# Altium schematic symbol library Semi-ATE.SchLib: 322 symbols (part 1 of 6) (continued)
## ADA4807-1AKSZ (continued)
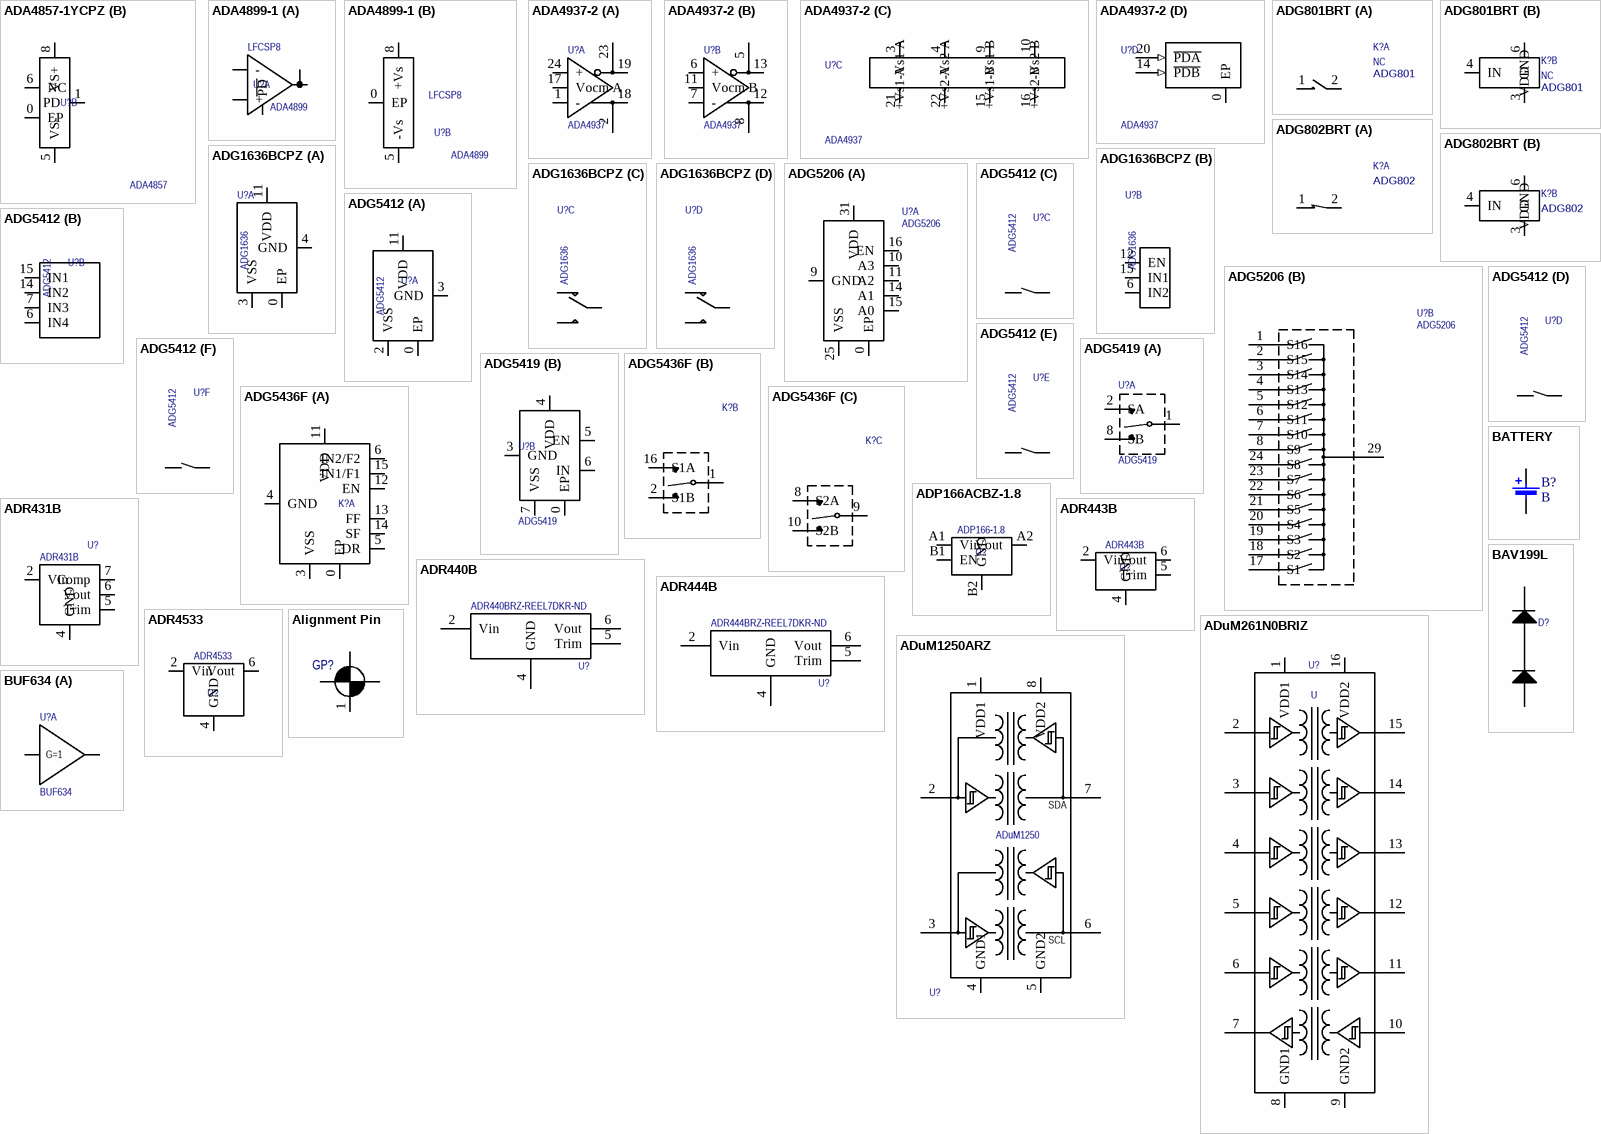
[diagram p4: symbols ADA4857-1YCPZ to BUF634]

## ADA4857-1YCPZ
designator U?, comment NicName: ADA4857  (hidden comment: U)
IC OPAMP VFB 1 CIRCUIT 8LFCSP; 04. Manufacturer: Analog Devices Inc.; 07. Manufacturer  Part Number: ADA4857-1YCPZ-R7; 03. Unit Price: 3.47; 13. Created Date/Name: AUG 2018 / Hören; ComponentLink1Description: Info; ComponentLink1URL: https://www.digikey.de/products/en/integrated-circuits-ics/linear-amplifiers-instrumentation-op-amps-buffer-amps/687?k=ADA4857-1YCPZ&k=&pkeyword=ADA4857-1YCPZ&sv=0&pv7=243&pv1989=0&sf=0&quantity=&ColumnSort=0&page=1&pageSize=25; ComponentLink2Description: DataSheet; ComponentLink2URL: https://www.analog.com/media/en/technical-documentation/data-sheets/ADA4857-1_4857-2.pdf; 01. Distributor: DigiKey; 02. Distributor Part Number: ADA4857-1YCPZ-R7DKR-ND; Package: 8-LFCSP-VD
footprint CP-8-13 (8-Lead LFCSP (3X3))
part A pins: 2 FB, 3 -, 4 +, 7 OUT
part B pins: 0 EP, 1 PD, 5 VS- (power), 6 NC, 8 VS+ (power)

## ADA4899-1
designator U?, comment Package: LFCSP8  NicName: ADA4899  (hidden comment: U)
IC OPAMP VFB 600MHZ 8LFCSP; 04. Manufacturer: Analog Devices Inc.; 07. Manufacturer  Part Number: ADA4899-1YCPZ-R7; 03. Unit Price: 4.56; 13. Created Date/Name: AUG 2018 / Hören; Design: AWGDIG; 3D-Export: No; 01. Distributor: DigiKey; 02. Distributor Part Number: ADA4899-1YCPZ-R7DKR-ND; 09. Operating Temperature: -40°C ~ 125°C; 11. RoHS: YES; ComponentLink1Description: Info; ComponentLink1URL: https://www.digikey.de/products/en/integrated-circuits-ics/linear-amplifiers-instrumentation-op-amps-buffer-amps/687?k=ADA4899&k=&pkeyword=ADA4899&pv7=243&sf=0&FV=1f140000%2Cffe002af%2C142c1449&quantity=&ColumnSort=0&page=1&pageSize=25; ComponentLink2Description: DataSheet; ComponentLink2URL: https://www.analog.com/media/en/technical-documentation/data-sheets/ADA4899-1.pdf
footprint CP-8-13
part A pins: 1 ~{PD}, 2 FB, 3 -, 4 +, 7 OUT
part B pins: 0 EP, 5 -Vs, 8 +Vs
1 alternate drawing of the same symbol

## ADA4937-2
designator U?, comment NicName: ADA4937  (hidden comment: U)
IC ADC DRIVER DIFF DUAL 24LFCSP; 04. Manufacturer: Analog Devices Inc.; 07. Manufacturer  Part Number: ADA4937-2YCPZ-R7; 03. Unit Price: 10.76; 13. Created Date/Name: AUG 2018 / Hören; 3D-Export: No; 01. Distributor: DigiKey; 02. Distributor Part Number: ADA4937-2YCPZ-R7DKR-ND; 11. RoHS: YES; ComponentLink1Description: Info; ComponentLink2Description: DataSheet; ComponentLink2URL: https://media.digikey.com/pdf/Data%20Sheets/Analog%20Devices%20PDFs/ADA4937-1,2.pdf
footprint QFN 4x4 24 Lead (LFCSP_WQ, 24 Leads, 4x4 mm outline); pin to pad 15>16 16>15 22>21
part A pins: 1 -, 2 +FB A, 17 Vocm A, 18 +OUT A, 19 -OUT A, 23 -FB A, 24 +
part B pins: 5 -FB B, 6 +, 7 -, 8 +FB B, 11 Vocm B, 12 +OUT B, 13 -OUT B
part C pins: 3 +Vs1 A (power), 4 +Vs2 A (power), 9 +Vs1 B (power), 10 +Vs2 B (power), 15 -Vs1 B (power), 16 -Vs2 B (power), 21 -Vs1 A (power), 22 -Vs2 A (power)
part D pins: 0 EP, 14 ~{PDB} (in), 20 ~{PDA} (in)

## ADG801BRT
designator K?, comment Type: NC  NickName: ADG801  (hidden comment: K)
IC SWITCH SPST NO SOT23-6; 04. Manufacturer: Analog Devices Inc.; 07. Manufacturer  Part Number: ADG801BRTZ-REEL7; 03. Unit Price: 0.98; 01. Distributor: DigiKey; 02. Distributor Part Number: ADG801BRTZ-REEL7TR-ND; 09. Operating Temperature: -20°C ~ +125°C; ComponentLink1Description: Info; ComponentLink1URL: https://www.digikey.de/product-detail/de/analog-devices-inc/ADG801BRTZ-REEL7/ADG801BRTZ-REEL7TR-ND/995397; ComponentLink2Description: DataSheet; ComponentLink2URL: https://www.analog.com/media/en/technical-documentation/data-sheets/ADG801_802.pdf
footprint SOT23-6 (RJ-6)
part A pins: 1 D, 2 S
part B pins: 3 GND, 4 IN, 6 VDD (power)

## ADG802BRT
designator K?, comment NickName: ADG802  (hidden comment: K)
IC SWITCH SPST NC SOT23-6; 04. Manufacturer: Analog Devices Inc.; 07. Manufacturer  Part Number: ADG802BRTZ-REEL7; 03. Unit Price: 0.98; 01. Distributor: DigiKey; 02. Distributor Part Number: ADG802BRTZ-REEL7TR-ND; 09. Operating Temperature: -20°C ~ +125°C; ComponentLink1Description: Info; ComponentLink1URL: https://www.digikey.de/products/de?keywords=ADG802BRTZ-REEL7TR-ND; ComponentLink2Description: DataSheet; ComponentLink2URL: https://www.analog.com/media/en/technical-documentation/data-sheets/ADG801_802.pdf
footprint SOT23-6 (RJ-6)
part A pins: 1 D, 2 S
part B pins: 3 GND, 4 IN, 6 VDD (power)
1 alternate drawing of the same symbol

## ADG1636BCPZ
designator U?, comment NicName: ADG1636  (hidden comment: U)
IC SWITCH DUAL SPDT 16LFCSP; 04. Manufacturer: Analog Devices Inc.; 07. Manufacturer  Part Number: ADG1636BCPZ-REEL7; 03. Unit Price: 4.62; 13. Created Date/Name: AUG 2018 / Hören; 3D-Export: No; 01. Distributor: DigiKey; 02. Distributor Part Number: ADG1636BCPZ-REEL7DKR-ND; 09. Operating Temperature: -40°C ~ 125°C (TA); 11. RoHS: YES; ComponentLink1Description: Info; ComponentLink1URL: https://www.digikey.de/product-detail/en/analog-devices-inc/ADG1636BCPZ-REEL7/ADG1636BCPZ-REEL7DKR-ND/2027503; ComponentLink2Description: DataSheet; ComponentLink2URL: https://www.analog.com/media/en/technical-documentation/data-sheets/ADG1636.pdf; Package: 16-LFCSP-VQ (4x4)
footprint CP-16-26 (Analog Devices 16 lead LFCSP 4x4mm 0.75mm height)
part A pins: 0 EP (power), 3 VSS (power), 4 GND, 11 VDD (power)
part B pins: 6 IN2, 12 EN, 15 IN1
part C pins: 1 D1, 2 S1B, 16 S1A
part D pins: 8 S2A, 9 D2, 10 S2B

## ADG5206
designator U?, comment NicName: ADG5206  (hidden comment: U)
IC MUX 1 X 16:1 32LFCSP; 04. Manufacturer: Analog Devices; 07. Manufacturer  Part Number: ADG5206BCPZ; 03. Unit Price: 10.53; 13. Created Date/Name: AUG 2018 / Hören; 3D-Export: No; ComponentLink1Description: Info; 01. Distributor: Digi-Key; 02. Distributor Part Number: ADG5206BCPZ-RL7CT-ND; ComponentLink2Description: DataSheet; ComponentLink2URL: http://www.analog.com/media/en/technical-documentation/data-sheets/ADG5206_5207.pdf
footprint LFCSP32
part A pins: 0 EP (power), 9 GND, 10 A3, 11 A2, 14 A1, 15 A0, 16 EN, 25 VSS (power), 31 VDD (power)
part B pins: 1 S16, 2 S15, 3 S14, 4 S13, 5 S12, 6 S11, 7 S10, 8 S9, 17 S1, 18 S2, 19 S3, 20 S4, 21 S5, 22 S6, 23 S7, 24 S8, 29 DA

## ADG5412
designator U?, comment NicName: ADG5412  (hidden comment: U)
IC SWITCH QUAD SPST BID 16LFCSP; 04. Manufacturer: Analog Devices Inc.; 07. Manufacturer  Part Number: ADG5412BFBCPZ-RL7; 03. Unit Price: 8.73; 13. Created Date/Name: AUG 2018 / Hören; 3D-Export: No; 01. Distributor: DigiKey; 02. Distributor Part Number: ADG5412BFBCPZ-RL7DKR-ND; 09. Operating Temperature: -40°C ~ 125°C (TA); 11. RoHS: YES; ComponentLink1Description: Info; ComponentLink1URL: https://www.digikey.de/product-detail/en/analog-devices-inc/ADG5412BFBCPZ-RL7/ADG5412BFBCPZ-RL7DKR-ND/8753330; ComponentLink2Description: DataSheet; ComponentLink2URL: https://www.analog.com/media/en/technical-documentation/data-sheets/ADG5412BF_5413BF.pdf; Package: 16-LFCSP-WQ (CP-16-17)
footprint CP-16-17 (16 lead LFCSP 4x4mm)
part A pins: 0 EP (power), 2 VSS (power), 3 GND, 11 VDD (power)
part B pins: 6 IN4, 7 IN3, 14 IN2, 15 IN1
part C pins: 1 S1, 16 D1
part D pins: 12 S2, 13 D2
part E pins: 8 D3, 9 S3
part F pins: 4 S4, 5 D4

## ADG5419
designator U?, comment NicName: ADG5419  (hidden comment: U)
IC SWITCH SINGLE SPDT 8LFCSP; 04. Manufacturer: Analog Devices Inc.; 07. Manufacturer  Part Number: ADG5419BCPZ-RL7; 03. Unit Price: 4.18; 13. Created Date/Name: AUG 2018 / Hören; 3D-Export: No; 01. Distributor: DigiKey; 02. Distributor Part Number: ADG5419BCPZ-RL7DKR-ND; 09. Operating Temperature: -40°C ~ 125°C; 11. RoHS: YES; ComponentLink1Description: Info; ComponentLink1URL: https://www.digikey.de/product-detail/en/analog-devices-inc/ADG5419BCPZ-RL7/ADG5419BCPZ-RL7DKR-ND/5233051; ComponentLink2Description: DataSheet; ComponentLink2URL: https://www.analog.com/media/en/technical-documentation/data-sheets/ADG5419.pdf
footprint CP-8-4 (8-Lead LFCSP_WD (2x3mm))
part A pins: 1 D, 2 SA, 8 SB
part B pins: 0 EP (power), 3 GND, 4 VDD (power), 5 EN, 6 IN, 7 VSS (power)

## ADG5436F
designator K?, comment K  (value not drawn)
IC SWITCH DUAL SPDT 16LFCSP; 04. Manufacturer: Analog Devices Inc.; 07. Manufacturer  Part Number: ADG5436FBCPZ-RL7; 03. Unit Price: 8.52; 13. Created Date/Name: AUG 2018 / Hören; NicName: ADG5436F; 3D-Export: No; 01. Distributor: DigiKey; 02. Distributor Part Number: ADG5436FBCPZ-RL7DKR-ND; 09. Operating Temperature: -40°C ~ 125°C (TA); 11. RoHS: YES; ComponentLink1Description: Info; ComponentLink1URL: https://www.digikey.de/products/en/integrated-circuits-ics/interface-analog-switches-multiplexers-demultiplexers/747?k=ADG5436&k=&pkeyword=ADG5436&sv=0&pv7=243&sf=0&FV=1ea8002e%2Cffe002eb%2C142c15f1&quantity=&ColumnSort=0&page=1&pageSize=25; ComponentLink2Description: DataSheet; ComponentLink2URL: https://www.analog.com/media/en/technical-documentation/data-sheets/ADG5436F.pdf; Package: CP-16-17
footprint CP-16-17 (16 lead LFCSP 4x4mm)
part A pins: 0 EP, 3 VSS, 4 GND, 5 DR, 6 IN2/F2, 11 VDD, 12 EN, 13 FF, 14 SF, 15 IN1/F1
part B pins: 1 D1, 2 S1B, 16 S1A
part C pins: 8 S2A, 9 D2, 10 S2B

## ADP166ACBZ-1.8
designator U?, comment NicName: ADP166-1.8  (hidden comment: U)
IC REG LINEAR 1.8V 150MA 4WLCSP; 04. Manufacturer: Analog Devices Inc.; 07. Manufacturer  Part Number: ADR443BRZ; 03. Unit Price: 8.25; 13. Created Date/Name: AUG 2018 / Hören; 3D-Export: No; 01. Distributor: DigiKey; 02. Distributor Part Number: ADR443BRZ-ND; 09. Operating Temperature: -40°C ~ 125°C; 11. RoHS: YES; ComponentLink1Description: Info; ComponentLink1URL: https://www.digikey.de/products/de?keywords=ADP166ACBZ-1.8-R7; ComponentLink2Description: DataSheet; ComponentLink2URL: https://www.analog.com/media/en/technical-documentation/data-sheets/ADP165_166.pdf
footprint CB-4-1 (4-Ball WLCSP)
pins: A1 Vin, A2 Vout, B1 EN, B2 GND

## ADR431B
designator U?, comment NicName: ADR431B  (hidden comment: U)
IC VREF SERIES 2.5V 8MSOP; 04. Manufacturer: Analog Devices Inc.; 07. Manufacturer  Part Number: ADR431BRMZ-R7; 03. Unit Price: 8.83; 13. Created Date/Name: AUG 2018 / Hören; Design: AWGDIG; 3D-Export: No; ComponentLink1Description: Info; ComponentLink1URL: https://www.digikey.de/product-detail/en/analog-devices-inc/ADR431BRMZ-R7/ADR431BRMZ-R7DKR-ND/4913101; 01. Distributor: DigiKey; 02. Distributor Part Number: ADR431BRMZ-R7DKR-ND; 09. Operating Temperature: -40°C ~ 125°C; 11. RoHS: YES; ComponentLink2Description: DataSheet; ComponentLink2URL: https://www.analog.com/media/en/technical-documentation/data-sheets/ADR430_431_433_434_435.pdf
footprint MSOP8(RM-8) (8-Lead MSOP)
pins: 2 Vin, 4 GND, 5 Trim, 6 Vout, 7 Comp

## ADR440B
designator U?, comment 02. Distributor Part Number: ADR440BRZ-REEL7DKR-ND  (hidden comment: U)
IC VREF SERIES 2.048V 8SOIC; 04. Manufacturer: Analog Devices Inc.; 07. Manufacturer  Part Number: ADR440BRZ-REEL7; 03. Unit Price: 8.25; 13. Created Date/Name: AUG 2018 / Hören; Design: AWGDIG; 3D-Export: No; 01. Distributor: DigiKey; 09. Operating Temperature: -40°C ~ 125°C; 11. RoHS: YES; ComponentLink1Description: Info; ComponentLink1URL: https://www.digikey.de/product-detail/en/analog-devices-inc/ADR440BRZ-REEL7/ADR440BRZ-REEL7DKR-ND/4913659; ComponentLink2Description: DataSheet; ComponentLink2URL: https://www.analog.com/media/en/technical-documentation/data-sheets/ADR440_441_443_444_445.pdf
footprint SOIC8 (R-8) (Generic 8 lead SOIC Narrow Body)
pins: 2 Vin, 4 GND, 5 Trim, 6 Vout

## ADR443B
designator U?, comment NicName: ADR443B  (hidden comment: U)
IC VREF SERIES 3V 8SOIC; 04. Manufacturer: Analog Devices Inc.; 07. Manufacturer  Part Number: ADR443BRZ; 03. Unit Price: 8.25; 13. Created Date/Name: AUG 2018 / Hören; 3D-Export: No; 01. Distributor: DigiKey; 02. Distributor Part Number: ADR443BRZ-ND; 09. Operating Temperature: -40°C ~ 125°C; 11. RoHS: YES; ComponentLink1Description: Info; ComponentLink1URL: https://www.digikey.de/products/en?keywords=ADR443BRZ-ND; ComponentLink2Description: DataSheet; ComponentLink2URL: https://www.analog.com/media/en/technical-documentation/data-sheets/ADR440_441_443_444_445.pdf
footprint SOIC8 (R-8) (Generic 8 lead SOIC Narrow Body)
pins: 2 Vin, 4 GND, 5 Trim, 6 Vout

## ADR444B
designator U?, comment 02. Distributor Part Number: ADR444BRZ-REEL7DKR-ND  (hidden comment: U)
IC VREF SERIES 4.096V 8SOIC; 04. Manufacturer: Analog Devices Inc.; 07. Manufacturer  Part Number: ADR444BRZ-REEL7; 03. Unit Price: 8.25; 13. Created Date/Name: AUG 2018 / Hören; Design: AWGDIG; 3D-Export: No; 01. Distributor: DigiKey; 09. Operating Temperature: -40°C ~ 125°C; 11. RoHS: YES; ComponentLink1Description: Info; ComponentLink1URL: https://www.digikey.de/product-detail/en/analog-devices-inc/ADR444BRZ-REEL7/ADR444BRZ-REEL7DKR-ND/3674865; ComponentLink2Description: DataSheet; ComponentLink2URL: https://www.analog.com/media/en/technical-documentation/data-sheets/ADR440_441_443_444_445.pdf
footprint SOIC8 (R-8) (Generic 8 lead SOIC Narrow Body)
pins: 2 Vin, 4 GND, 5 Trim, 6 Vout

## ADR4533
designator U?, comment NicName: ADR4533  (hidden comment: U)
IC VREF SERIES 3.3V 8SOIC; 04. Manufacturer: Analog Devices Inc.; 07. Manufacturer  Part Number: ADR4533BRZ; 03. Unit Price: 7.42; 13. Created Date/Name: AUG 2018 / Hören; 3D-Export: No; 01. Distributor: DigiKey; 02. Distributor Part Number: ADR4533BRZ-ND; 09. Operating Temperature: -40°C ~ 125°C; 11. RoHS: YES; ComponentLink1Description: Info; ComponentLink1URL: https://www.digikey.de/product-detail/en/analog-devices-inc/ADR4533BRZ/ADR4533BRZ-ND/3340522; ComponentLink2Description: DataSheet; ComponentLink2URL: https://www.analog.com/media/en/technical-documentation/data-sheets/ADR4520_4525_4530_4533_4540_4550.pdf; Package: SOIC8
footprint SOIC8 (R-8) (Generic 8 lead SOIC Narrow Body)
pins: 2 Vin, 4 GND, 6 Vout

## ADuM261N0BRIZ
designator U?, comment U
DGTL ISO 5KV 6CH GEN PRP 16SOIC; 04. Manufacturer: Analog Devices; 07. Manufacturer  Part Number: ADUM261N0BRIZ; 03. Unit Price: 9.78; 05. Quantity: 1; 13. Created Date/Name: AUG 2018 / Hören; 3D-Export: No; 01. Distributor: Digi-Key; 02. Distributor Part Number: ADUM261N0BRIZ-ND; 09. Operating Temperature: -40°C ~ 125°C; 11. RoHS: YES; ComponentLink1Description: Info; ComponentLink1URL: https://www.digikey.de/product-detail/en/analog-devices-inc/ADUM261N0BRIZ/ADUM261N0BRIZ-ND/6624096; ComponentLink2Description: DataSheet; ComponentLink2URL: http://www.analog.com/media/en/technical-documentation/data-sheets/ADuM260N-261N-262N-263N.pdf
footprint SOIC16W (RI-16-2)
pins: 1 VDD1, 2 VIA, 3 VIB, 4 VIC, 5 VID, 6 VIE, 7 VOF, 8 GND1, 9 GND2, 10 VIF, 11 VOE, 12 VOD, 13 VOC, 14 VOB, 15 VOA, 16 VDD2

## ADuM1250ARZ
designator U?, comment NicName: ADuM1250  (hidden comment: U)
DGTL ISOL 2500VRMS 2CH I2C 8SOIC; 04. Manufacturer: Analog Devices Inc.; 07. Manufacturer  Part Number: ADUM1250ARZ-RL7; 03. Unit Price: 4.75; 13. Created Date/Name: AUG 2018 / Hören; 01. Distributor: DigiKey; 02. Distributor Part Number: ADUM1250ARZ-RL7DKR-ND; 11. RoHS: YES; ComponentLink1Description: Info; ComponentLink1URL: https://www.digikey.de/products/de?keywords=ADUM1250ARZ-RL7DKR-ND; ComponentLink2Description: DataSheet; ComponentLink2URL: https://www.analog.com/media/en/technical-documentation/data-sheets/ADUM1250_1251.pdf; Package: SOIC8 (R8)
footprint SOIC8 (R-8) (Generic 8 lead SOIC Narrow Body)
pins: 1 VDD1, 2 VIA, 3 VIB, 4 GND1, 5 GND2, 6 VIE, 7 VOF, 8 VDD2
text: SDA; SCL

## Alignment Pin
designator GP?, comment GP  (value not drawn)
Board to Backplane Alignment Pin; 04. Manufacturer: Samtec; 07. Manufacturer  Part Number: [see model description]; 13. Created Date/Name: AUG 2018 / Hören; 3D-Export: No; 01. Distributor: Samtec; ComponentLink1Description: Info; ComponentLink2Description: DataSheet
footprint EGBF-RA-20 (Alignment with Backplane (Card Side))
footprint EGBM-VT-2-25.3-20 (Alignment with Card (Bacplane Side))
pins: 1

## BATTERY
designator B?, comment B
BATTERY HOLDER COIN 12MM TH; MFR-PN: 103; MFR-TYPE: Coin Cell Battery Holder 20mm; MFR: KEYSTONE; POPULATED: yes; 03. Unit Price: 1.42; 3D-Export: No; 01. Distributor: Mouser; 02. Distributor Part Number: 534-103; 04. Manufacturer: Keystone; 07. Manufacturer  Part Number: 103; 11. RoHS: YES; ComponentLink4Description: Info; ComponentLink4URL: https://www.mouser.de/ProductDetail/Renata/HU357-LF?qs=%2Fha2pyFadujb%252BjPSOXiRz7fkC43b9Pf0VN0uI1M5lhU%3D; ComponentLink5Description: DataSheet; ComponentLink5URL: https://www.mouser.de/datasheet/2/346/HU357-LF-30189.pdf
footprint KEYSTONE-BATTHLDR-103
pins: 1, 2
2 alternate drawings of the same symbol

## BAV199L
designator D?, comment D  (value not drawn)
DIODE ARRAY GP 70V 215MA SOT23-3; 04. Manufacturer: ON Semiconductor; 07. Manufacturer  Part Number: BAV199LT1G; 03. Unit Price: 0.19; 13. Created Date/Name: AUG 2018 / Hören; NicName: BAV199L; 3D-Export: No; 01. Distributor: DigiKey; 02. Distributor Part Number: BAV199LT1GOSDKR-ND; 09. Operating Temperature: -65°C ~ 150°C; 11. RoHS: YES; ComponentLink1Description: Info; ComponentLink1URL: https://www.digikey.de/product-detail/en/on-semiconductor/BAV199LT1G/BAV199LT1GOSDKR-ND/1831717; ComponentLink2Description: DataSheet; ComponentLink2URL: http://www.onsemi.com/pub/Collateral/BAV199LT1-D.PDF; Package: SOT23-3
footprint SOT23-3
pins: 1 A, 2 C, 3 C/A

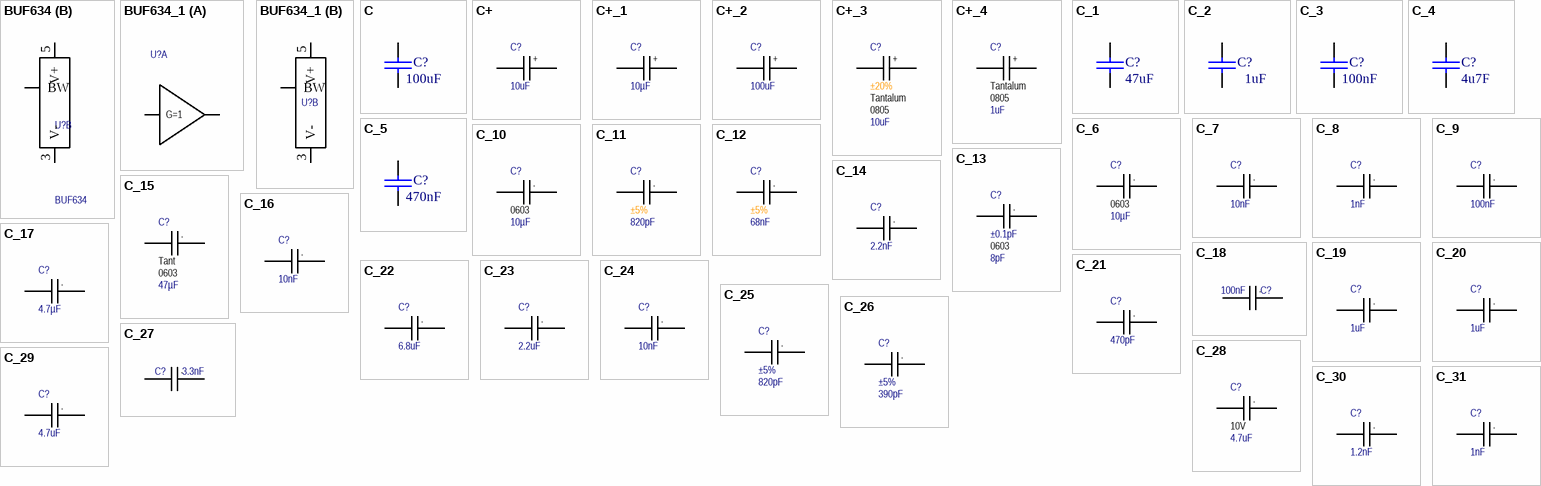
[diagram p5: symbols BUF634 to C_31]

## BUF634
designator U?, comment NicName: BUF634  (hidden comment: U)
IC OPAMP BUFFER 180MHZ TO220-5; 04. Manufacturer: Texas Instruments; 07. Manufacturer  Part Number: BUF634T; 03. Unit Price: 10.34; 13. Created Date/Name: AUG 2018 / Hören; Design: AWGDIG; 3D-Export: No; 01. Distributor: DigiKey; 02. Distributor Part Number: BUF634T-ND; 09. Operating Temperature: -40°C ~ 85°C; 11. RoHS: YES; ComponentLink1Description: Info; ComponentLink1URL: https://www.digikey.de/product-detail/en/texas-instruments/BUF634T/BUF634T-ND/251039; ComponentLink2Description: DataSheet; ComponentLink2URL: http://www.ti.com/lit/ds/symlink/buf634.pdf
footprint TO-220-5-Standing
part A pins: 2 IN, 4 OUT
part B pins: 1 BW, 3 V-, 5 V+
part A text: G=1

## BUF634_1
designator U?, comment U  (value not drawn)
IC OPAMP BUFFER 180MHZ TO220-5; 04. Manufacturer: Texas Instruments; 07. Manufacturer  Part Number: BUF634T; 03. Unit Price: 10.34; 13. Created Date/Name: AUG 2018 / Hören; NicName: BUF634; Design: AWGDIG; 3D-Export: No; 01. Distributor: DigiKey; 02. Distributor Part Number: https://www.digikey.de/product-detail/en/texas-instruments/BUF634T/BUF634T-ND/251039; 09. Operating Temperature: -40°C ~ 85°C; 11. RoHS: YES; ComponentLink1Description: Info; ComponentLink1URL: https://www.digikey.de/product-detail/en/texas-instruments/BUF634T/BUF634T-ND/251039; ComponentLink2Description: DataSheet; ComponentLink2URL: http://www.ti.com/lit/ds/symlink/buf634.pdf
footprint TO-220-5-Standing
part A pins: 2 IN, 4 OUT
part B pins: 1 BW, 3 V-, 5 V+
part A text: G=1

## C
designator C?  value 100uF  (hidden comment: C)
CAP CER 100UF 6.3V X7S 1210; MFR-PN: GRM32EC70J107ME15L; MFR: MURATA; 04. Manufacturer: Murata Electronics North America; POPULATED: yes; Parameters: X7S, 6V3, 20%; 03. Unit Price: 0.67; Tolerance: 20%; Voltage Rating: 6V3; 3D-Export: No; Temperature Range: -40°C/+85°C; 01. Distributor: DigiKey; 02. Distributor Part Number: 490-10530-6-ND; 07. Manufacturer  Part Number: GRM32EC70J107ME15L; 09. Operating Temperature: -55°C ~ 125°C; 11. RoHS: YES; ComponentLink1Description: Info; ComponentLink1URL: https://www.digikey.de/product-detail/en/murata-electronics-north-america/GRM32EC70J107ME15L/490-10530-6-ND/5027076; Type: X7S; ComponentLink4Description: DataSheet; ComponentLink4URL: https://search.murata.co.jp/Ceramy/image/img/A01X/G101/ENG/GRM32EC70J107ME15-01.pdf
footprint C1210 (Footprint not found)
signal-integrity model Cap
simulation model CAP
pins: 1, 2
2 alternate drawings of the same symbol

## C+
designator C?  value 10uF  (hidden comment: C+)
Capacitor Polarized; 04. Manufacturer: AVX Corporation; 07. Manufacturer  Part Number: TPST106K016H0800; Tolerance: ±10%; ESR: 800mOhm @ 100kHz; Voltage Rating: 16V; Type: Tantalum; 03. Unit Price: 0.5; 13. Created Date/Name: AUG2018/Hören; 3D-Export: No; ComponentLink1Description: Info; ComponentLink1URL: *; 02. Distributor Part Number: TPST106K016H0800-ND; 09. Operating Temperature: -55°C ~ 125°C; 11. RoHS: YES; 01. Distributor: DigiKey; ComponentLink2Description: DataSheet; Package: 1210
simulation model CAP (Capacitor)
signal-integrity model Cap
footprint SMD-CAP-ALU-A (Ø3.0mm x 5.4mm)
footprint SMD-CAP-ALU-B (Ø4.0mm x 5.4mm)
footprint SMD-CAP-ALU-C (Ø5.0mm x 5.4mm)
footprint SMD-CAP-ALU-D (Ø6.3mm x 5.4mm)
footprint SMD-CAP-ALU-D8 (Ø6.3mm x 7.7mm)
footprint SMD-CAP-ALU-E (Ø8.0mm x 6.2mm)
footprint SMD-CAP-ALU-F (Ø8.0mm x 10.2mm)
footprint SMD-CAP-ALU-G (Ø10.0mm x 10.2mm)
footprint SMD-CAP-ALU-G13 (Ø10.0mm x 13.5mm)
footprint SMD-CAP-ALU-G17 (Ø10.0mm x 16.5mm)
footprint SMD-CAP-ALU-H16 (Ø12.5mm x 16.5mm)
footprint SMD-CAP-ALU-K16 (Ø18mm x 16.5mm)
footprint C0603+ Reflow (SMT Capacitor 0603 Polarized Reflow Soldering)
footprint C0603+ Wave (SMT Capacitor 0603 Polarized Wave Soldering)
footprint C1206+ Reflow (SMT Capacitor 1206 Polarized Reflow Soldering)
footprint C1206+ Wave (SMT Capacitor 1206 Polarized Wave Soldering)
footprint C1210+ Reflow (SMT Capacitor 1210 Polarized Reflow Soldering)
footprint C1210+ Wave (SMT Capacitor 1210 Polarized Wave Soldering)
footprint C2312+ Reflow (SMT Capacitor 2312 Polarized Reflow Soldering)
footprint C2312+ Wave (SMT Capacitor 2312 Polarized Wave Soldering)
footprint C0805+ Reflow (SMT Capacitor 0805 Polarized Reflow Soldering)
footprint C0805+ Wave (SMT Capacitor 0805 Polarized Wave Soldering)
pins: 1, 2
text: +

## C+_1
designator C?, comment value 10µF  (hidden comment: C+)